# Altium footprint library BBC_Connectors.PcbLib: 142 footprints (part 4 of 9)
Each footprint in its own frame and in the unit in brackets; x right, y up, seen from the top. Pads: shape width x height; smd on the part's side, far side on the other; paste and mask are expansions set on the pad; w line width, h text height; cw(c..) or ccw(c..) is an arc to the next point about the centre after c.
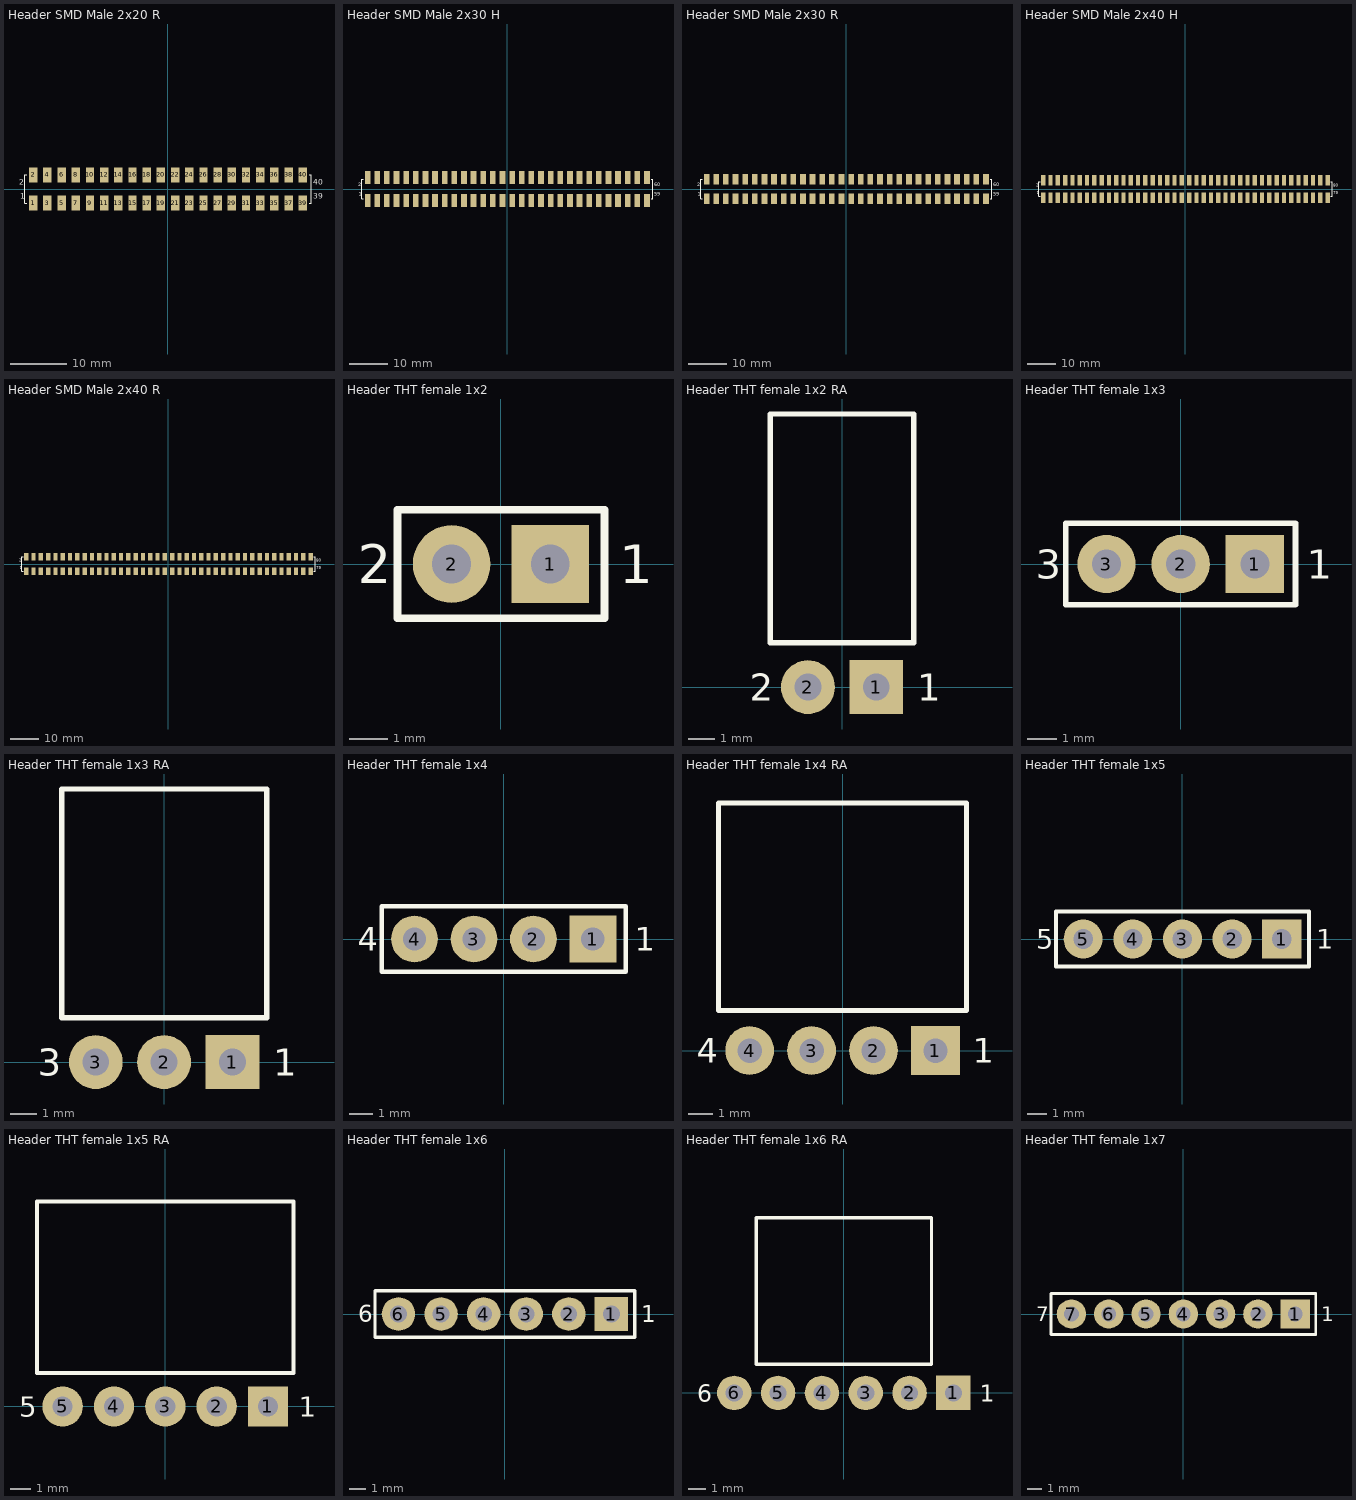
[diagram p3: the footprints below, top view; thin cyan lines are the x and y axes]

## Header SMD Male 2x20 R [mm] "male header for smd mounting / pitch = 2.54mm / reflow soldering"
height 11
pads (40):
  rect 1.5x2.7 smd: 1(-24.13,-2.54) 2(-24.13,2.54) 3(-21.59,-2.54) 4(-21.59,2.54) 5(-19.05,-2.54) 6(-19.05,2.54) 7(-16.51,-2.54) 8(-16.51,2.54) 9(-13.97,-2.54) 10(-13.97,2.54) 11(-11.43,-2.54) 12(-11.43,2.54) 13(-8.89,-2.54) 14(-8.89,2.54) 15(-6.35,-2.54) 16(-6.35,2.54) 17(-3.81,-2.54) 18(-3.81,2.54) 19(-1.27,-2.54) 20(-1.27,2.54) 21(1.27,-2.54) 22(1.27,2.54) 23(3.81,-2.54) 24(3.81,2.54) 25(6.35,-2.54) 26(6.35,2.54) 27(8.89,-2.54) 28(8.89,2.54) 29(11.43,-2.54) 30(11.43,2.54) 31(13.97,-2.54) 32(13.97,2.54) 33(16.51,-2.54) 34(16.51,2.54) 35(19.05,-2.54) 36(19.05,2.54) 37(21.59,-2.54) 38(21.59,2.54) 39(24.13,-2.54) 40(24.13,2.54)
Top Overlay:
  lines w0.2: -25.273,-2.54 -25.654,-2.54 -25.654,2.54 -25.273,2.54 ; 25.273,-2.54 25.654,-2.54 25.654,2.54 25.273,2.54
  text "1" at -26.416,-1.77 h1
  text "2" at -26.67,0.77 h1
  text "40" at 26.035,0.77 h1
  text "39" at 26.035,-1.77 h1
3D body "Header SMD Male 2x20.step": height 8.78, standoff -0.04, extent -25.4,-3.694 25.4,3.694

## Header SMD Male 2x30 H [mm] "male header for smd mounting / pitch = 2.54mm / hand soldering"
height 11
pads (60):
  rect 1.5x3.5 smd: 1(-36.83,-3.048) 2(-36.83,3.048) 3(-34.29,-3.048) 4(-34.29,3.048) 5(-31.75,-3.048) 6(-31.75,3.048) 7(-29.21,-3.048) 8(-29.21,3.048) 9(-26.67,-3.048) 10(-26.67,3.048) 11(-24.13,-3.048) 12(-24.13,3.048) 13(-21.59,-3.048) 14(-21.59,3.048) 15(-19.05,-3.048) 16(-19.05,3.048) 17(-16.51,-3.048) 18(-16.51,3.048) 19(-13.97,-3.048) 20(-13.97,3.048) 21(-11.43,-3.048) 22(-11.43,3.048) 23(-8.89,-3.048) 24(-8.89,3.048) 25(-6.35,-3.048) 26(-6.35,3.048) 27(-3.81,-3.048) 28(-3.81,3.048) 29(-1.27,-3.048) 30(-1.27,3.048) 31(1.27,-3.048) 32(1.27,3.048) 33(3.81,-3.048) 34(3.81,3.048) 35(6.35,-3.048) 36(6.35,3.048) 37(8.89,-3.048) 38(8.89,3.048) 39(11.43,-3.048) 40(11.43,3.048) 41(13.97,-3.048) 42(13.97,3.048) 43(16.51,-3.048) 44(16.51,3.048) 45(19.05,-3.048) 46(19.05,3.048) 47(21.59,-3.048) 48(21.59,3.048) 49(24.13,-3.048) 50(24.13,3.048) 51(26.67,-3.048) 52(26.67,3.048) 53(29.21,-3.048) 54(29.21,3.048) 55(31.75,-3.048) 56(31.75,3.048) 57(34.29,-3.048) 58(34.29,3.048) 59(36.83,-3.048) 60(36.83,3.048)
Top Overlay:
  lines w0.2: -37.973,-2.54 -38.354,-2.54 -38.354,2.54 -37.973,2.54 ; 37.973,-2.54 38.354,-2.54 38.354,2.54 37.973,2.54
  text "1" at -39.116,-1.77 h1
  text "2" at -39.37,0.77 h1
  text "60" at 38.735,0.77 h1
  text "59" at 38.735,-1.77 h1
3D body "Header SMD Male 2x30.step": height 8.78, standoff -0.04, extent -38.1,-3.694 38.1,3.694

## Header SMD Male 2x30 R [mm] "male header for smd mounting / pitch = 2.54mm / reflow soldering"
height 11
pads (60):
  rect 1.5x2.7 smd: 1(-36.83,-2.54) 2(-36.83,2.54) 3(-34.29,-2.54) 4(-34.29,2.54) 5(-31.75,-2.54) 6(-31.75,2.54) 7(-29.21,-2.54) 8(-29.21,2.54) 9(-26.67,-2.54) 10(-26.67,2.54) 11(-24.13,-2.54) 12(-24.13,2.54) 13(-21.59,-2.54) 14(-21.59,2.54) 15(-19.05,-2.54) 16(-19.05,2.54) 17(-16.51,-2.54) 18(-16.51,2.54) 19(-13.97,-2.54) 20(-13.97,2.54) 21(-11.43,-2.54) 22(-11.43,2.54) 23(-8.89,-2.54) 24(-8.89,2.54) 25(-6.35,-2.54) 26(-6.35,2.54) 27(-3.81,-2.54) 28(-3.81,2.54) 29(-1.27,-2.54) 30(-1.27,2.54) 31(1.27,-2.54) 32(1.27,2.54) 33(3.81,-2.54) 34(3.81,2.54) 35(6.35,-2.54) 36(6.35,2.54) 37(8.89,-2.54) 38(8.89,2.54) 39(11.43,-2.54) 40(11.43,2.54) 41(13.97,-2.54) 42(13.97,2.54) 43(16.51,-2.54) 44(16.51,2.54) 45(19.05,-2.54) 46(19.05,2.54) 47(21.59,-2.54) 48(21.59,2.54) 49(24.13,-2.54) 50(24.13,2.54) 51(26.67,-2.54) 52(26.67,2.54) 53(29.21,-2.54) 54(29.21,2.54) 55(31.75,-2.54) 56(31.75,2.54) 57(34.29,-2.54) 58(34.29,2.54) 59(36.83,-2.54) 60(36.83,2.54)
Top Overlay:
  lines w0.2: -37.973,-2.54 -38.354,-2.54 -38.354,2.54 -37.973,2.54 ; 37.973,-2.54 38.354,-2.54 38.354,2.54 37.973,2.54
  text "59" at 38.735,-1.77 h1
  text "60" at 38.735,0.77 h1
  text "2" at -39.37,0.77 h1
  text "1" at -39.116,-1.77 h1
3D body "Header SMD Male 2x30.step": height 8.78, standoff -0.04, extent -38.1,-3.694 38.1,3.694

## Header SMD Male 2x40 H [mm] "male header for smd mounting / pitch = 2.54mm / hand soldering"
height 11
pads (80):
  rect 1.5x3.5 smd: 1(-49.53,-3.048) 2(-49.53,3.048) 3(-46.99,-3.048) 4(-46.99,3.048) 5(-44.45,-3.048) 6(-44.45,3.048) 7(-41.91,-3.048) 8(-41.91,3.048) 9(-39.37,-3.048) 10(-39.37,3.048) 11(-36.83,-3.048) 12(-36.83,3.048) 13(-34.29,-3.048) 14(-34.29,3.048) 15(-31.75,-3.048) 16(-31.75,3.048) 17(-29.21,-3.048) 18(-29.21,3.048) 19(-26.67,-3.048) 20(-26.67,3.048) 21(-24.13,-3.048) 22(-24.13,3.048) 23(-21.59,-3.048) 24(-21.59,3.048) 25(-19.05,-3.048) 26(-19.05,3.048) 27(-16.51,-3.048) 28(-16.51,3.048) 29(-13.97,-3.048) 30(-13.97,3.048) 31(-11.43,-3.048) 32(-11.43,3.048) 33(-8.89,-3.048) 34(-8.89,3.048) 35(-6.35,-3.048) 36(-6.35,3.048) 37(-3.81,-3.048) 38(-3.81,3.048) 39(-1.27,-3.048) 40(-1.27,3.048) 41(1.27,-3.048) 42(1.27,3.048) 43(3.81,-3.048) 44(3.81,3.048) 45(6.35,-3.048) 46(6.35,3.048) 47(8.89,-3.048) 48(8.89,3.048) 49(11.43,-3.048) 50(11.43,3.048) 51(13.97,-3.048) 52(13.97,3.048) 53(16.51,-3.048) 54(16.51,3.048) 55(19.05,-3.048) 56(19.05,3.048) 57(21.59,-3.048) 58(21.59,3.048) 59(24.13,-3.048) 60(24.13,3.048) 61(26.67,-3.048) 62(26.67,3.048) 63(29.21,-3.048) 64(29.21,3.048) 65(31.75,-3.048) 66(31.75,3.048) 67(34.29,-3.048) 68(34.29,3.048) 69(36.83,-3.048) 70(36.83,3.048) 71(39.37,-3.048) 72(39.37,3.048) 73(41.91,-3.048) 74(41.91,3.048) 75(44.45,-3.048) 76(44.45,3.048) 77(46.99,-3.048) 78(46.99,3.048) 79(49.53,-3.048) 80(49.53,3.048)
Top Overlay:
  lines w0.2: -50.673,-2.54 -51.054,-2.54 -51.054,2.54 -50.673,2.54 ; 50.673,-2.54 51.054,-2.54 51.054,2.54 50.673,2.54
  text "79" at 51.435,-1.77 h1
  text "80" at 51.435,0.77 h1
  text "2" at -52.07,0.77 h1
  text "1" at -51.816,-1.77 h1
3D body "Header SMD Male 2x40.step": height 8.78, standoff -0.04, extent -50.8,-3.694 50.8,3.694

## Header SMD Male 2x40 R [mm] "male header for smd mounting / pitch = 2.54mm / reflow soldering"
height 11
pads (80):
  rect 1.5x2.7 smd: 1(-49.53,-2.54) 2(-49.53,2.54) 3(-46.99,-2.54) 4(-46.99,2.54) 5(-44.45,-2.54) 6(-44.45,2.54) 7(-41.91,-2.54) 8(-41.91,2.54) 9(-39.37,-2.54) 10(-39.37,2.54) 11(-36.83,-2.54) 12(-36.83,2.54) 13(-34.29,-2.54) 14(-34.29,2.54) 15(-31.75,-2.54) 16(-31.75,2.54) 17(-29.21,-2.54) 18(-29.21,2.54) 19(-26.67,-2.54) 20(-26.67,2.54) 21(-24.13,-2.54) 22(-24.13,2.54) 23(-21.59,-2.54) 24(-21.59,2.54) 25(-19.05,-2.54) 26(-19.05,2.54) 27(-16.51,-2.54) 28(-16.51,2.54) 29(-13.97,-2.54) 30(-13.97,2.54) 31(-11.43,-2.54) 32(-11.43,2.54) 33(-8.89,-2.54) 34(-8.89,2.54) 35(-6.35,-2.54) 36(-6.35,2.54) 37(-3.81,-2.54) 38(-3.81,2.54) 39(-1.27,-2.54) 40(-1.27,2.54) 41(1.27,-2.54) 42(1.27,2.54) 43(3.81,-2.54) 44(3.81,2.54) 45(6.35,-2.54) 46(6.35,2.54) 47(8.89,-2.54) 48(8.89,2.54) 49(11.43,-2.54) 50(11.43,2.54) 51(13.97,-2.54) 52(13.97,2.54) 53(16.51,-2.54) 54(16.51,2.54) 55(19.05,-2.54) 56(19.05,2.54) 57(21.59,-2.54) 58(21.59,2.54) 59(24.13,-2.54) 60(24.13,2.54) 61(26.67,-2.54) 62(26.67,2.54) 63(29.21,-2.54) 64(29.21,2.54) 65(31.75,-2.54) 66(31.75,2.54) 67(34.29,-2.54) 68(34.29,2.54) 69(36.83,-2.54) 70(36.83,2.54) 71(39.37,-2.54) 72(39.37,2.54) 73(41.91,-2.54) 74(41.91,2.54) 75(44.45,-2.54) 76(44.45,2.54) 77(46.99,-2.54) 78(46.99,2.54) 79(49.53,-2.54) 80(49.53,2.54)
Top Overlay:
  lines w0.2: -50.673,-2.54 -51.054,-2.54 -51.054,2.54 -50.673,2.54 ; 50.673,-2.54 51.054,-2.54 51.054,2.54 50.673,2.54
  text "1" at -51.816,-1.77 h1
  text "2" at -52.07,0.77 h1
  text "80" at 51.435,0.77 h1
  text "79" at 51.435,-1.77 h1
3D body "Header SMD Male 2x40.step": height 8.78, standoff -0.04, extent -50.8,-3.694 50.8,3.694

## Header THT female 1x2 [mm] "header for tht mounting / pitch = 2.54mm"
height 11
pads (2):
  rect 2x2 hole 1: 1(1.27,0)
  round 2 hole 1: 2(-1.27,0)
Top Overlay:
  lines w0.2: -2.667,-1.397 -2.667,1.397 2.667,1.397 2.667,-1.397 -2.667,-1.397
  text "2" at -3.683,-0.5 h1
  text "1" at 3.048,-0.5 h1
3D body: height 2.51, standoff -3, extent 2.54,3.81 2.54,3.81
3D body "Header THT female 1x2.step": height 8.5, standoff -3.2, extent -2.54,-1.27 2.54,1.27

## Header THT female 1x2 RA [mm] "right angled header for tht mounting / pitch = 2.54mm"
height 3
pads (2):
  rect 2x2 hole 1: 1(1.27,0)
  round 2 hole 1: 2(-1.27,0)
Top Overlay:
  lines w0.2: -2.667,1.651 2.667,1.651 2.667,10.151 -2.667,10.151 -2.667,1.651
  text "1" at 2.794,-0.5 h1
  text "2" at -3.429,-0.5 h1
3D body "Header THT female 1x2 RA.step": height 2.54, standoff -3.06, extent -2.54,-0.199 2.54,10.151
3D body: height 2.51, standoff -3, extent 2.54,3.81 2.54,3.81

## Header THT female 1x3 [mm] "header for tht mounting / pitch = 2.54mm"
height 11
pads (3):
  rect 2x2 hole 1: 1(2.54,0)
  round 2 hole 1: 2(0,0) 3(-2.54,0)
Top Overlay:
  lines w0.2: -3.937,-1.397 3.937,-1.397 3.937,1.397 -3.937,1.397 -3.937,-1.397
  text "3" at -4.953,-0.5 h1
  text "1" at 4.318,-0.5 h1
3D body: height 2.51, standoff -3, extent 2.54,3.81 2.54,3.81
3D body "Header THT female 1x3.step": height 8.5, standoff -3.2, extent -3.81,-1.27 3.81,1.27

## Header THT female 1x3 RA [mm] "right angled header for tht mounting / pitch = 2.54mm"
height 3
pads (3):
  rect 2x2 hole 1: 1(2.54,0)
  round 2 hole 1: 2(0,0) 3(-2.54,0)
Top Overlay:
  lines w0.2: -3.81,1.651 -3.81,10.151 3.81,10.151 3.81,1.651 -3.81,1.651
  text "3" at -4.699,-0.5 h1
  text "1" at 4.064,-0.5 h1
3D body: height 2.51, standoff -3, extent 2.54,3.81 2.54,3.81
3D body "Header THT female 1x3 RA.step": height 2.54, standoff -3.06, extent -3.81,-0.199 3.81,10.151

## Header THT female 1x4 [mm] "header for tht mounting / pitch = 2.54mm"
height 11
pads (4):
  rect 2x2 hole 1: 1(3.81,0)
  round 2 hole 1: 2(1.27,0) 3(-1.27,0) 4(-3.81,0)
Top Overlay:
  lines w0.2: -5.207,-1.397 -5.207,1.397 5.207,1.397 5.207,-1.397 -5.207,-1.397
  text "4" at -6.223,-0.5 h1
  text "1" at 5.588,-0.5 h1
3D body "Header THT female 1x4.step": height 8.5, standoff -3.2, extent -5.08,-1.27 5.08,1.27
3D body: height 2.51, standoff -3, extent 2.54,3.81 2.54,3.81

## Header THT female 1x4 RA [mm] "right angled header for tht mounting / pitch = 2.54mm"
height 3
pads (4):
  rect 2x2 hole 1: 1(3.81,0)
  round 2 hole 1: 2(1.27,0) 3(-1.27,0) 4(-3.81,0)
Top Overlay:
  lines w0.2: -5.08,1.651 -5.08,10.151 5.08,10.151 5.08,1.651 -5.08,1.651
  text "4" at -5.969,-0.5 h1
  text "1" at 5.334,-0.5 h1
3D body "Header THT female 1x4 RA.step": height 2.54, standoff -3.06, extent -5.08,-0.199 5.08,10.151
3D body: height 2.51, standoff -3, extent 2.54,3.81 2.54,3.81

## Header THT female 1x5 [mm] "header for tht mounting / pitch = 2.54mm"
height 11
pads (5):
  rect 2x2 hole 1: 1(5.08,0)
  round 2 hole 1: 2(2.54,0) 3(0,0) 4(-2.54,0) 5(-5.08,0)
Top Overlay:
  lines w0.2: -6.477,-1.397 -6.477,1.397 6.477,1.397 6.477,-1.397 -6.477,-1.397
  text "5" at -7.493,-0.5 h1
  text "1" at 6.858,-0.5 h1
3D body "Header THT female 1x5.step": height 8.5, standoff -3.2, extent -6.35,-1.27 6.35,1.27
3D body: height 2.51, standoff -3, extent 2.54,3.81 2.54,3.81

## Header THT female 1x5 RA [mm] "right angled header for tht mounting / pitch = 2.54mm"
height 3
pads (5):
  rect 2x2 hole 1: 1(5.08,0)
  round 2 hole 1: 2(2.54,0) 3(0,0) 4(-2.54,0) 5(-5.08,0)
Top Overlay:
  lines w0.2: -6.35,1.651 -6.35,10.151 6.35,10.151 6.35,1.651 -6.35,1.651
  text "5" at -7.239,-0.5 h1
  text "1" at 6.604,-0.5 h1
3D body "Header THT female 1x5 RA.step": height 2.54, standoff -3.06, extent -6.35,-0.199 6.35,10.151
3D body: height 2.51, standoff -3, extent 2.54,3.81 2.54,3.81

## Header THT female 1x6 [mm] "header for tht mounting / pitch = 2.54mm"
height 11
pads (6):
  rect 2x2 hole 1: 1(6.35,0)
  round 2 hole 1: 2(3.81,0) 3(1.27,0) 4(-1.27,0) 5(-3.81,0) 6(-6.35,0)
Top Overlay:
  lines w0.2: -7.747,-1.397 -7.747,1.397 7.747,1.397 7.747,-1.397 -7.747,-1.397
  text "1" at 8.128,-0.5 h1
  text "6" at -8.763,-0.5 h1
3D body "Header THT female 1x6.step": height 8.5, standoff -3.2, extent -7.62,-1.27 7.62,1.27
3D body: height 2.51, standoff -3, extent 2.54,3.81 2.54,3.81

## Header THT female 1x6 RA [mm] "right angled header for tht mounting / pitch = 2.54mm"
height 3
pads (6):
  rect 2x2 hole 1: 1(6.35,0)
  round 2 hole 1: 2(3.81,0) 3(1.27,0) 4(-1.27,0) 5(-3.81,0) 6(-6.35,0)
Top Overlay:
  lines w0.2: -5.08,1.651 5.08,1.651 5.08,10.151 -5.08,10.151 -5.08,1.651
  text "1" at 7.874,-0.5 h1
  text "6" at -8.509,-0.5 h1
3D body "Header THT female 1x6 RA.step": height 2.54, standoff -3.06, extent -7.62,-0.199 7.62,10.151
3D body: height 2.51, standoff -3, extent 2.54,3.81 2.54,3.81

## Header THT female 1x7 [mm] "header for tht mounting / pitch = 2.54mm"
height 11
pads (7):
  rect 2x2 hole 1: 1(7.62,0)
  round 2 hole 1: 2(5.08,0) 3(2.54,0) 4(0,0) 5(-2.54,0) 6(-5.08,0) 7(-7.62,0)
Top Overlay:
  lines w0.2: -9.017,-1.397 -9.017,1.397 9.017,1.397 9.017,-1.397 -9.017,-1.397
  text "1" at 9.398,-0.5 h1
  text "7" at -10.033,-0.5 h1
3D body "Header THT female 1x7.step": height 8.5, standoff -3.2, extent -8.89,-1.27 8.89,1.27
3D body: height 2.51, standoff -3, extent 2.54,3.81 2.54,3.81